# Altium footprint library master.PcbLib: 64 footprints (part 1 of 4)
Each footprint in its own frame and in the unit in brackets; x right, y up, seen from the top. Pads: shape width x height; smd on the part's side, far side on the other; paste and mask are expansions set on the pad; w line width, h text height; cw(c..) or ccw(c..) is an arc to the next point about the centre after c.
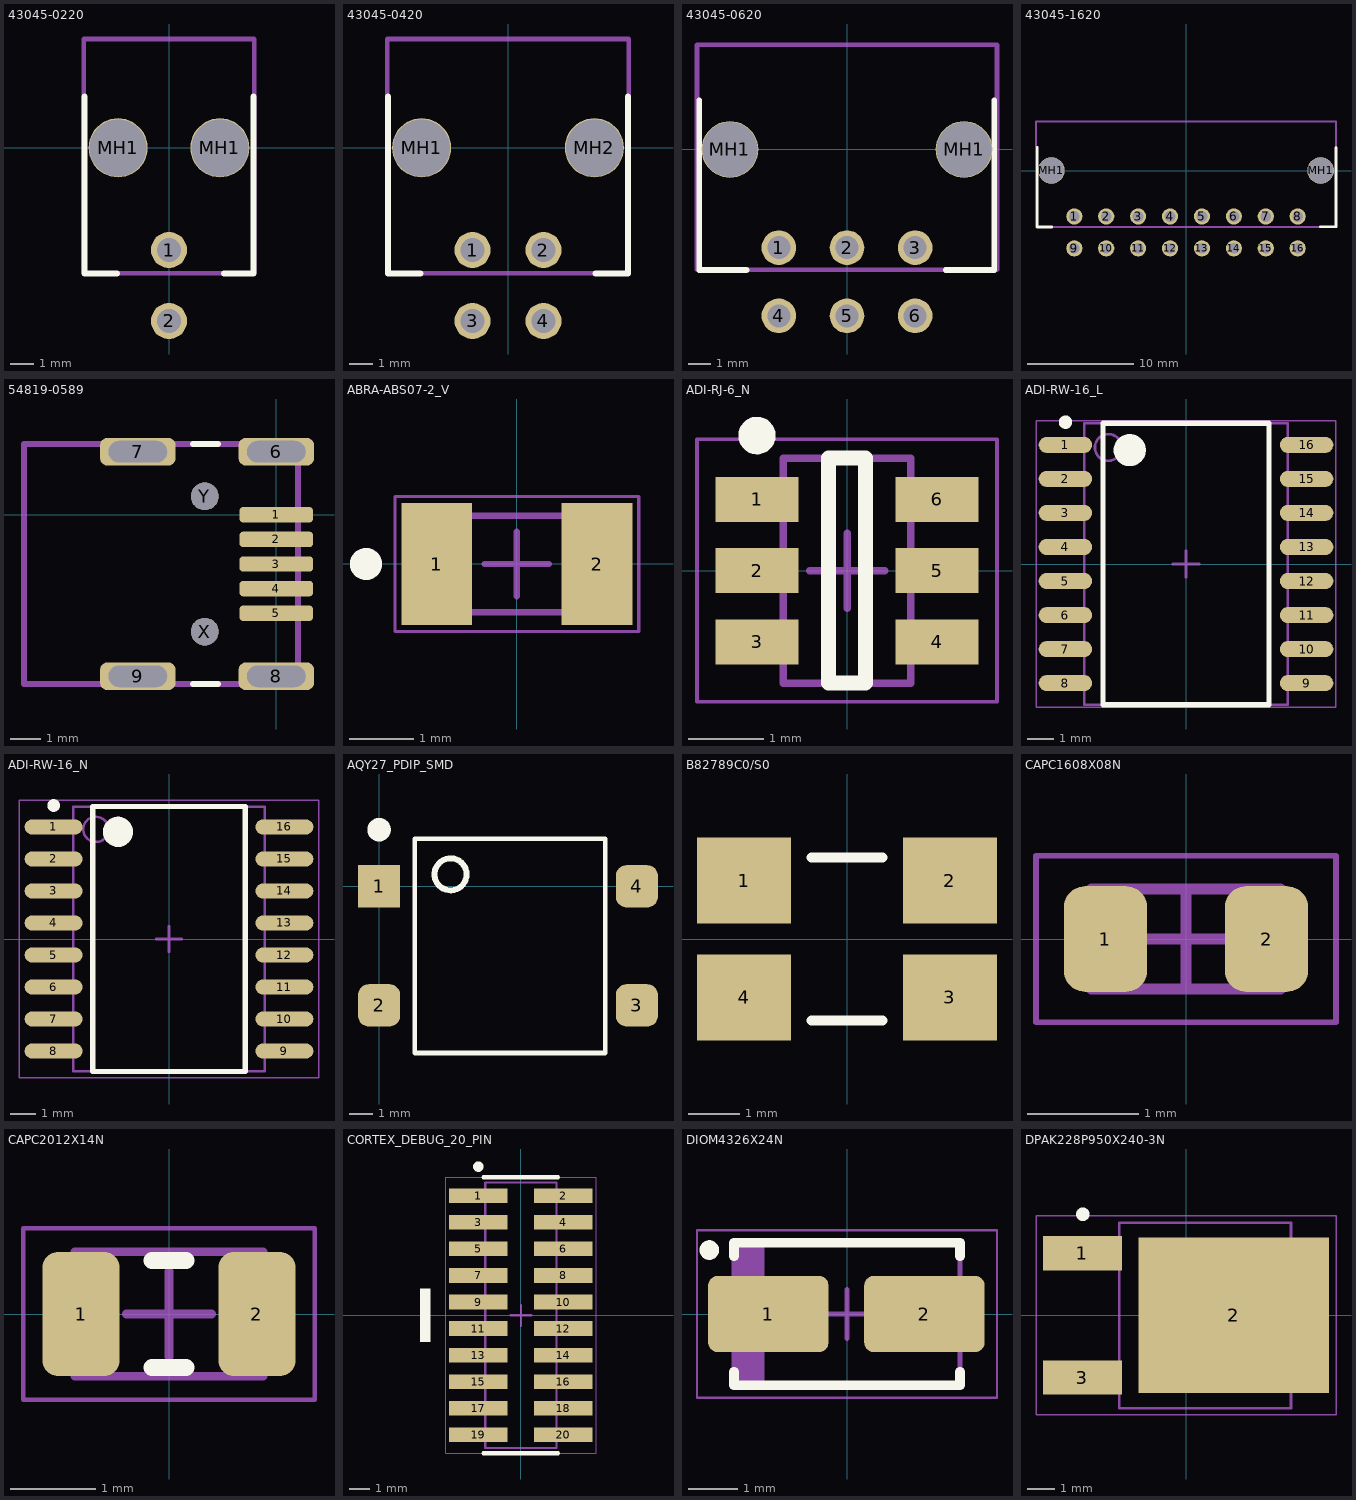
[diagram p0: the footprints below, top view; thin cyan lines are the x and y axes]

## 43045-0220 [mm] "Micro-Fit 3.0 Right Angle Header, 3.00mm Pitch, Dual Row, 2 Circuits, with Snap-in Plastic Peg PCB Lock, Tin, Glow Wire Capable, Black, 43045-0200"
height 8.763
pads (4):
  round 1.524 hole 1.016: 1(0,-4.32) 2(0,-7.32)
  round 2.5 hole 2.41 paste-5 mask+0.15: MH1(-2.15,0) MH1(2.15,0)
Top Overlay:
  lines w0.254: -3.573,2.159 -3.573,-5.309 -2.201,-5.309 ; 2.328,-5.309 3.573,-5.309 3.573,2.159
Mechanical 15:
  lines w0.2: -3.6,-5.3 3.6,-5.3 3.6,4.6 -3.6,4.6 -3.6,-5.3
3D body "430450221.stp": height 8.77, standoff -3.18, extent -3.575,-7.644 3.625,4.596

## 43045-0420 [mm] "Micro-Fit 3.0 Right Angle Header, 3.00mm Pitch, Dual Row, 4 Circuits, with Snap-in Plastic Peg PCB Lock, Tin, Glow Wire Capable, Black, 43045-0421"
height 8.763
pads (6):
  round 1.524 hole 1.016: 1(-1.5,-4.32) 2(1.5,-4.32) 3(-1.5,-7.32) 4(1.5,-7.32)
  round 2.5 hole 2.41 paste-5 mask+0.15: MH1(-3.65,0) MH2(3.65,0)
Top Overlay:
  lines w0.254: -5.08,2.159 -5.08,-5.309 -3.709,-5.309 ; 3.709,-5.309 5.08,-5.309 5.08,2.159
Mechanical 15:
  lines w0.2: -5.1,-5.3 5.1,-5.3 5.1,4.6 -5.1,4.6 -5.1,-5.3
3D body "43045-0421.stp": height 8.83, standoff -3.12, extent -5.075,-7.62 5.125,4.62

## 43045-0620 [mm] "Micro-Fit 3.0 Right Angle Header, 3.00mm Pitch, Dual Row, 6 Circuits, with Snap-in Plastic Peg PCB Lock, Tin, Glow Wire Capable, Black, 43045-0621"
height 8.763
pads (8):
  round 1.524 hole 1.016: 1(-3,-4.32) 2(0,-4.32) 3(3,-4.32) 4(-3,-7.32) 5(0,-7.32) 6(3,-7.32)
  round 2.5 hole 2.41 paste-5 mask+0.15: MH1(-5.15,0) MH1(5.15,0)
Top Overlay:
  lines w0.254: -6.502,2.159 -6.502,-5.309 -4.42,-5.309 ; 4.343,-5.309 6.477,-5.309 6.477,2.159
Mechanical 15:
  lines w0.2: -6.6,-5.3 6.6,-5.3 6.6,4.6 -6.6,4.6 -6.6,-5.3
3D body "43045-0621.stp": height 8.83, standoff -3.11, extent -6.559,-7.632 6.591,4.608

## 43045-1620 [mil] "Micro-Fit 3.0 Right Angle Header, 3.00mm Pitch, Dual Row, 16 Circuits, with Snap-in Plastic Peg PCB Lock, Tin, Glow Wire Capable, Black, 43045-1600"
height 345
pads (18):
  round 60 hole 40: 1(-413.39,-170) 2(-295.28,-170) 3(-177.17,-170) 4(-59.06,-170) 5(59.06,-170) 6(177.17,-170) 7(295.28,-170) 8(413.39,-170) 9(-413.39,-287.99) 10(-295.28,-287.99) 11(-177.17,-287.99) 12(-59.06,-287.99) 13(59.06,-287.99) 14(177.17,-287.99) 15(295.28,-287.99) 16(413.39,-287.99)
  round 98.43 hole 94.88 paste-196.85 mask+5.91: MH1(-498.03,0.08) MH1(498.03,0.08)
Top Overlay:
  lines w10: -551,85 -551,-209.02 -497,-209.02 ; 498.12,-208.66 555.12,-208.66 555.12,85.35
Mechanical 15:
  lines w7.87: -555.12,-208.66 555.12,-208.66 555.12,181.1 -555.12,181.1 -555.12,-208.66
3D body "430451621.stp": height 345.16, standoff -125.31, extent -554.13,-300.95 556.1,180.94

## 54819-0589 [mm] "Mini USB Connector, TH, Righer Angle"
height 3.95
pads (11):
  rrect50% 2.4x0.5 smd: 1(0,0) 2(0,-0.8) 3(0,-1.6) 4(0,-2.4) 5(0,-3.2)
  rrect50% 2.45x0.9 / inner rrect50% 0x0 / far side rrect50% 2.7x1.7 hole 0.7 slot 1.9 at 0 deg: 6(0,2.05) 7(-4.5,2.05) 8(0,-5.25) 9(-4.5,-5.25)
  round 0.9 hole 0.9 unplated: X(-2.325,-3.8) Y(-2.325,0.6)
Top Overlay:
  lines w0.2: -2.7,-5.5 -1.9,-5.5 ; -2.7,2.3 -1.9,2.3
Mechanical 15:
  lines w0.2: -8.2,-5.5 0.7,-5.5 0.7,2.3 -8.2,2.3 -8.2,-5.5
3D body "548190589.stp": height 4.05, standoff -1.8, extent -8.217,-5.457 0.783,2.243

## ABRA-ABS07-2_V [mm] "Hand Drawn, 2-Leads, Body 3.2x1.5mm, Pitch 2.5mm"
height 0.9
pads (2):
  rect 1.1x1.9 smd: 1(-1.25,0) 2(1.25,0)
Top Overlay:
  circle w0.25: c-2.35,0 r0.125
Mechanical 13:
  lines w0.1: -1.6,-0.75 1.6,-0.75 1.6,0.75 -1.6,0.75 -1.6,-0.75
Mechanical 15:
  lines w0.05: -1.9,-1.05 1.9,-1.05 1.9,1.05 -1.9,1.05 -1.9,-1.05
  lines w0.1: -0.5,0 0.5,0 ; 0,-0.5 0,0.5
3D body: height 0.9, standoff 0, extent -1.6,-0.75 1.6,0.75

## ADI-RJ-6_N [mm] "SOT23, 6-Leads, Body 2.9x1.6mm, Pitch 0.95mm, IPC Medium Density"
height 1.45
pads (6):
  rect 1.1x0.6 smd: 1(-1.2,0.95) 2(-1.2,0) 3(-1.2,-0.95) 4(1.2,-0.95) 5(1.2,0) 6(1.2,0.95)
Top Overlay:
  circle w0.25: c-1.2,1.8 r0.125
  lines w0.2: -0.25,-1.5 0.25,-1.5 0.25,1.5 -0.25,1.5 -0.25,-1.5
Mechanical 13:
  lines w0.1: -0.85,-1.5 0.85,-1.5 0.85,1.5 -0.85,1.5 -0.85,-1.5
Mechanical 15:
  lines w0.05: -2,-1.75 2,-1.75 2,1.75 -2,1.75 -2,-1.75
  lines w0.1: -0.5,0 0.5,0 ; 0,-0.5 0,0.5
3D body: height 1.45, standoff 0.05, extent -0.85,-1.5 0.85,1.5

## ADI-RW-16_L [mm] "SOIC, 16-Leads, Body 10.3x7.5mm, Pitch 1.27mm, IPC High Density"
height 2.65
pads (16):
  oval 2x0.6 smd: 1(-4.5,4.445) 2(-4.5,3.175) 3(-4.5,1.905) 4(-4.5,0.635) 5(-4.5,-0.635) 6(-4.5,-1.905) 7(-4.5,-3.175) 8(-4.5,-4.445) 9(4.5,-4.445) 10(4.5,-3.175) 11(4.5,-1.905) 12(4.5,-0.635) 13(4.5,0.635) 14(4.5,1.905) 15(4.5,3.175) 16(4.5,4.445)
Top Overlay:
  circle w0.25: c-4.5,5.295 r0.125
  circle w0.6: c-2.1,4.25 r0.3
  lines w0.2: -3.1,-5.25 3.1,-5.25 3.1,5.25 -3.1,5.25 -3.1,-5.25
Mechanical 13:
  circle w0.1: c-2.9,4.35 r0.5
  lines w0.1: -3.8,-5.25 -3.8,5.25 3.8,5.25 3.8,-5.25 -3.8,-5.25
Mechanical 15:
  lines w0.05: -5.6,-5.35 -5.6,5.35 5.6,5.35 5.6,-5.35 -5.6,-5.35
  lines w0.1: -0.5,0 0.5,0 ; 0,-0.5 0,0.5
3D body: height 2.65, standoff 0.1, extent -3.8,-5.25 3.8,5.25

## ADI-RW-16_N [mm] "SOIC, 16-Leads, Body 10.3x7.5mm, Pitch 1.27mm, IPC Medium Density"
height 2.65
pads (16):
  oval 2.3x0.6 smd: 1(-4.575,4.445) 2(-4.575,3.175) 3(-4.575,1.905) 4(-4.575,0.635) 5(-4.575,-0.635) 6(-4.575,-1.905) 7(-4.575,-3.175) 8(-4.575,-4.445) 9(4.575,-4.445) 10(4.575,-3.175) 11(4.575,-1.905) 12(4.575,-0.635) 13(4.575,0.635) 14(4.575,1.905) 15(4.575,3.175) 16(4.575,4.445)
Top Overlay:
  circle w0.25: c-4.575,5.295 r0.125
  circle w0.6: c-2.025,4.25 r0.3
  lines w0.2: -3.025,-5.25 -3.025,5.25 3.025,5.25 3.025,-5.25 -3.025,-5.25
Mechanical 13:
  circle w0.1: c-2.9,4.35 r0.5
  lines w0.1: -3.8,-5.25 -3.8,5.25 3.8,5.25 3.8,-5.25 -3.8,-5.25
Mechanical 15:
  lines w0.05: -5.95,-5.5 -5.95,5.5 5.95,5.5 5.95,-5.5 -5.95,-5.5
  lines w0.1: -0.5,0 0.5,0 ; 0,-0.5 0,0.5
3D body: height 2.65, standoff 0.1, extent -3.8,-5.25 3.8,5.25

## AQY27_PDIP_SMD [mm]
height 3.5
pads (4):
  rect 1.8x1.8 smd: 1(0,0)
  rrect50% 1.8x1.8 smd: 2(0,-5.08) 3(11,-5.08) 4(11,0)
Top Overlay:
  circle w0.254: c3.048,0.508 r0.684
  circle w0.6: c0,2.413 r0.2
  lines w0.2: 1.524,-7.112 1.524,2.032 6.77,2.032 9.652,2.032 9.652,-7.112 1.524,-7.112
3D body: height 2.15, standoff -2.15, extent 0.127,2.54 0.127,2.54
3D body: height 3.5, standoff 0.2, extent 1.143,-7.175 10.033,2.096

## B82789C0/S0 [mm] "SIMDAD 1812, common-mode chokes"
height 3
pads (4):
  rect 1.85x1.7 smd: 1(-2.025,1.15) 2(2.025,1.15) 3(2.025,-1.15) 4(-2.025,-1.15)
Top Overlay:
  lines w0.2: -0.7,-1.6 0.7,-1.6 ; -0.7,1.6 0.7,1.6
3D body: height 2.45, standoff 1.95, extent -2.6,-1.3 2.6,1.3
3D body: height 2.2, standoff 0, extent -2.275,0.9 -2.25,1.6
3D body: height 2.2, standoff 0, extent -2.275,-1.6 -2.25,-0.9
3D body: height 2.2, standoff 0, extent 2.25,0.9 2.275,1.6
3D body: height 2.2, standoff 0, extent 2.25,-1.6 2.275,-0.9
3D body: height 0.03, standoff 0, extent -2.25,0.9 -1.5,1.6
3D body: height 0.03, standoff 0, extent -2.25,-1.6 -1.5,-0.9
3D body: height 0.03, standoff 0, extent 1.5,0.9 2.25,1.6
3D body: height 0.03, standoff 0, extent 1.5,-1.6 2.25,-0.9
3D body: height 3, standoff 0.4, extent -2.25,-1.6 2.25,1.6

## CAPC1608X08N [mm] "Chip Capacitor, 2-Leads, Body 1,60x0,80mm, IPC Medium Density"
height 0.8
pads (2):
  rrect50% 0.75x0.95 smd: 1(-0.725,0) 2(0.725,0)
Mechanical 13:
  lines w0.1: -0.85,-0.45 -0.85,0.45 0.85,0.45 0.85,-0.45 -0.85,-0.45
Mechanical 15:
  lines w0.05: -1.35,-0.75 -1.35,0.75 1.35,0.75 1.35,-0.75 -1.35,-0.75
  lines w0.1: -0.45,0 0.45,0 ; 0,-0.45 0,0.45
3D body "CAPC1608X08N.step": height 0.8, standoff 0, extent -0.85,-0.45 0.85,0.45

## CAPC2012X14N [mm] "Chip Capacitor, 2-Leads, Body 2,00x1,25mm, IPC Medium Density"
height 1.45
pads (2):
  rrect40% 0.9x1.45 smd: 1(-1.025,0) 2(1.025,0)
Top Overlay:
  lines w0.2: -0.2,-0.625 0.2,-0.625 ; -0.2,0.625 0.2,0.625
Mechanical 13:
  lines w0.1: -1.1,-0.725 -1.1,0.725 1.1,0.725 1.1,-0.725 -1.1,-0.725
Mechanical 15:
  lines w0.05: -1.7,-1 1.7,-1 1.7,1 -1.7,1 -1.7,-1
  lines w0.1: -0.5,0 0.5,0 ; 0,-0.5 0,0.5
3D body "CAPC2012X14N.step": height 1.45, standoff 0, extent -1.1,-0.725 1.1,0.725

## CORTEX_DEBUG_20_PIN [mm] "ARM Cortex Debug Connector 20 Pin"
height 2.51
pads (20):
  rect 2.8x0.7 smd: 1(-2.035,5.715) 2(2.035,5.715) 3(-2.035,4.445) 4(2.035,4.445) 5(-2.035,3.175) 6(2.035,3.175) 7(-2.035,1.905) 8(2.035,1.905) 9(-2.035,0.635) 10(2.035,0.635) 11(-2.035,-0.635) 12(2.035,-0.635) 13(-2.035,-1.905) 14(2.035,-1.905) 15(-2.035,-3.175) 16(2.035,-3.175) 17(-2.035,-4.445) 18(2.035,-4.445) 19(-2.035,-5.715) 20(2.035,-5.715)
Top Overlay:
  circle w0.25: c-2.032,7.112 r0.125
  rectangle: -4.826,-1.27 -4.318,1.27
  lines w0.2: -1.778,-6.604 1.778,-6.604 ; -1.778,6.604 1.778,6.604
Mechanical 13:
  lines w0.1: -1.7,-6.35 -1.7,6.35 1.7,6.35 1.7,-6.35 -1.7,-6.35
Mechanical 15:
  lines w0.05: -3.6,-6.6 -3.6,6.6 3.6,6.6 3.6,-6.6 -3.6,-6.6
  lines w0.1: -0.5,0 0.5,0 ; 0,-0.5 0,0.5
3D body "FTSH-110-01-L-DV-007-K-P.stp": height 6.98, standoff -0.01, extent -2.921,-6.35 2.921,6.35

## DIOM4326X24N [mm] "Molded Diode, 2-Leads, Body 4,30x2,60mm, IPC Medium Density, SMA, DO-214AC"
height 2.4
pads (2):
  rrect25% 2.45x1.55 smd: 1(-1.6,0) 2(1.575,0)
Top Overlay:
  circle w0.2: c-2.8,1.3 r0.1
  lines w0.2: -2.3,-1.175 -2.3,-1.45 2.3,-1.45 2.3,-1.175 ; -2.3,1.175 -2.3,1.45 2.3,1.45 2.3,1.175
Mechanical 13:
  rectangle: -2.3,-1.45 -1.681,1.45
  lines w0.1: -2.3,-1.45 2.3,-1.45 2.3,1.45 -2.3,1.45 -2.3,-1.45
Mechanical 15:
  lines w0.05: -3.05,-1.7 3.05,-1.7 3.05,1.7 -3.05,1.7 -3.05,-1.7
  lines w0.1: -0.5,0 0.5,0 ; 0,-0.5 0,0.5
3D body "DIOM4326X24N.step": height 2.4, standoff 0, extent -2.52,-1.45 2.52,1.45

## DPAK228P950X240-3N [mm] "D-PAK, 3-Pads, Body 6,25x6,76mm (max), IPC Medium Density"
height 2.4
pads (3):
  rect 2.9x1.25 smd: 1(-3.8,2.28) 3(-3.8,-2.28)
  rect 7x5.7 smd: 2(1.75,0)
Top Overlay:
  circle w0.25: c-3.785,3.708 r0.125
Mechanical 13:
  lines w0.1: -2.45,-3.4 -2.45,3.4 3.85,3.4 3.85,-3.4 -2.45,-3.4
Mechanical 15:
  lines w0.05: -5.5,-3.65 -5.5,3.65 5.5,3.65 5.5,-3.65 -5.5,-3.65
  lines w0.1: -0.5,0 0.5,0 ; 0,-0.5 0,0.5
3D body "DPAK228P950X240-3N.step": height 2.4, standoff 0, extent -4.25,-3.4 5.25,3.4